# Altium footprint library PcbLib.PcbLib: 79 footprints (part 5 of 5)
Each footprint in its own frame and in the unit in brackets; x right, y up, seen from the top. Pads: shape width x height; smd on the part's side, far side on the other; paste and mask are expansions set on the pad; w line width, h text height; cw(c..) or ccw(c..) is an arc to the next point about the centre after c.
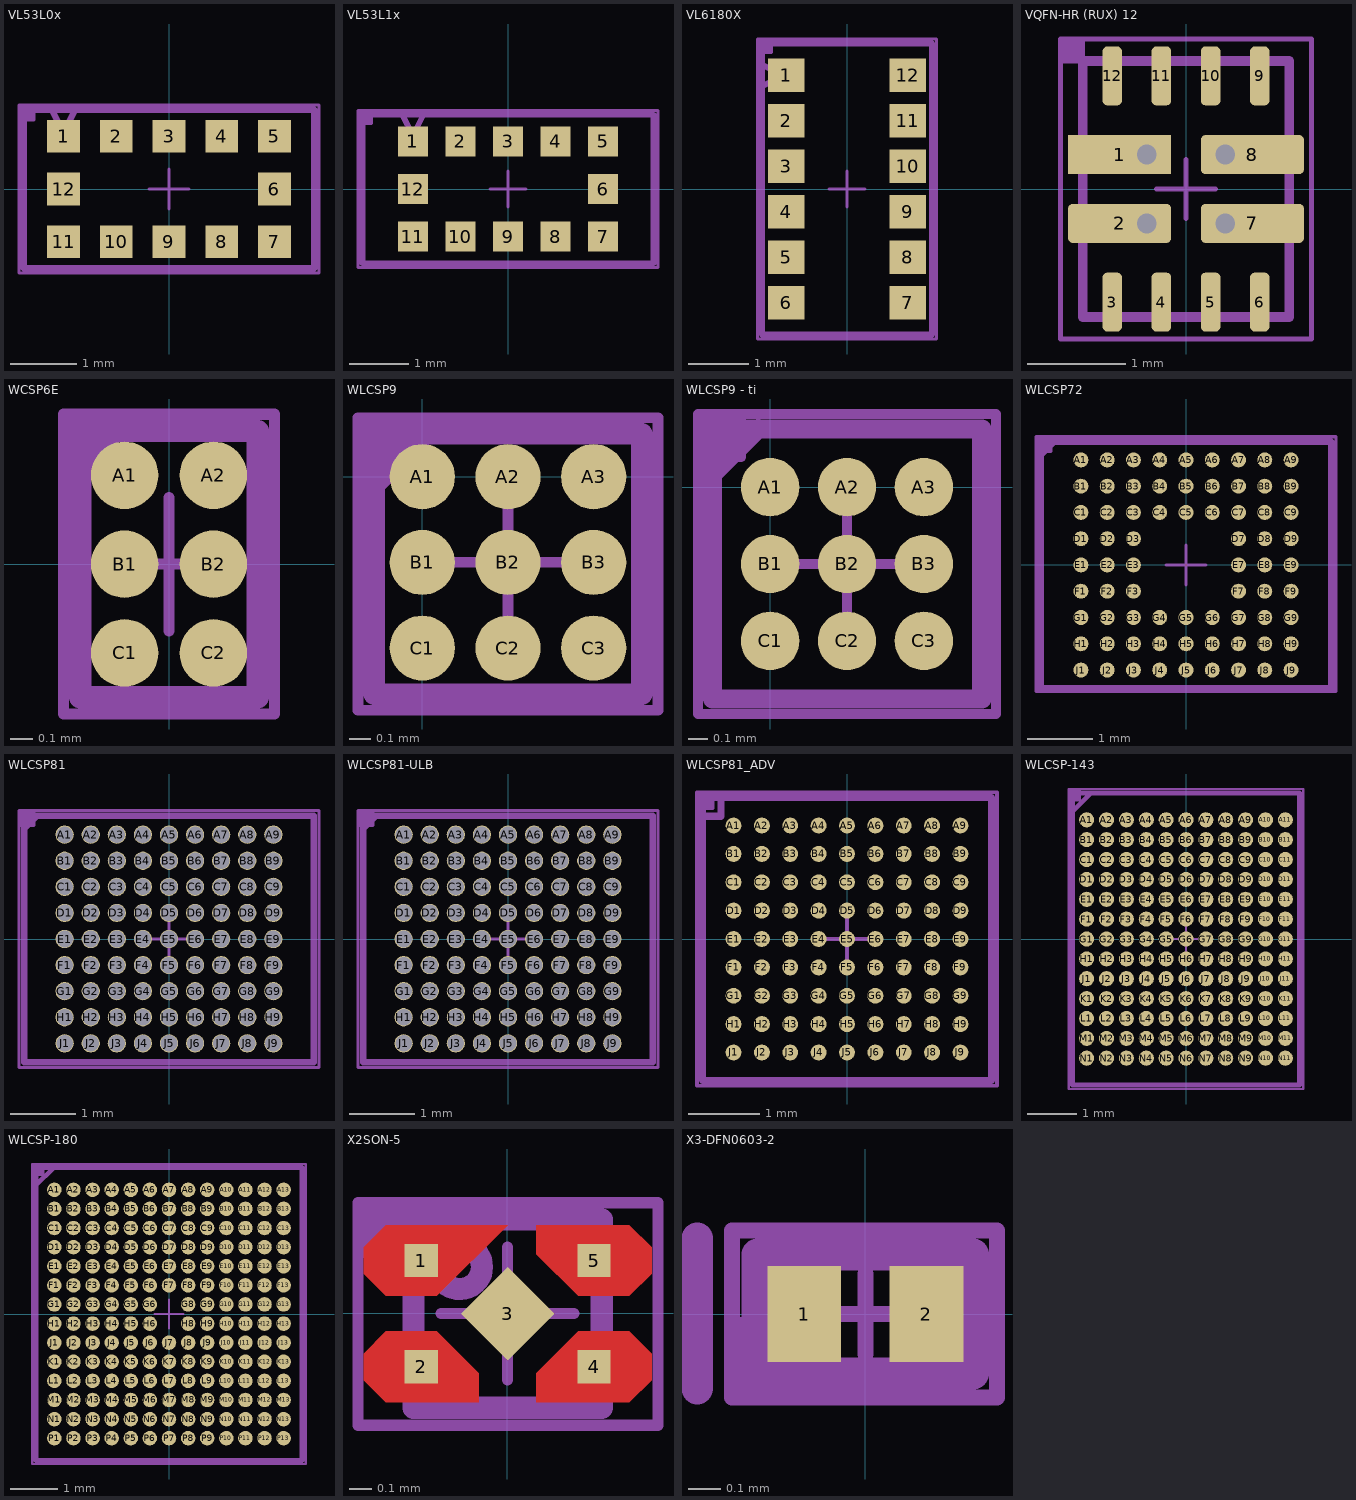
[diagram p4: the footprints below, top view; thin cyan lines are the x and y axes]

## VL53L0x [mm]
height 1
pads (12):
  rect 0.5x0.5 smd: 1(-1.6,0.8) 2(-0.8,0.8) 3(0,0.8) 4(0.8,0.8) 5(1.6,0.8) 6(1.6,0) 7(1.6,-0.8) 8(0.8,-0.8) 9(0,-0.8) 10(-0.8,-0.8) 11(-1.6,-0.8) 12(-1.6,0)
TopBody:
  lines w0.1: -1.778,1.2 -1.6,0.85 -1.422,1.2 ; -2.2,-1.2 -2.2,1.2 2.2,1.2 2.2,-1.2 -2.2,-1.2
TopCourtyard:
  region: -2.275,1.275 -2.275,1.05 -2.05,1.05 -2.05,1.275
  lines w0.05: -2.275,1.05 -2.05,1.05 -2.05,1.275 ; -0.3,0 0.3,0 ; 0,-0.3 0,0.3 ; -2.275,-1.275 -2.275,1.275 2.275,1.275 2.275,-1.275 -2.275,-1.275
3D body "VL53L0X.STEP": height 1, standoff 0, extent -2.2,-1.2 2.2,1.2

## VL53L1x [mm]
height 1.56
pads (12):
  rect 0.5x0.5 smd: 1(-1.6,0.8) 2(-0.8,0.8) 3(0,0.8) 4(0.8,0.8) 5(1.6,0.8) 6(1.6,0) 7(1.6,-0.8) 8(0.8,-0.8) 9(0,-0.8) 10(-0.8,-0.8) 11(-1.6,-0.8) 12(-1.6,0)
TopBody:
  lines w0.1: -1.778,1.25 -1.6,0.9 -1.422,1.25 ; -2.45,-1.25 -2.45,1.25 2.45,1.25 2.45,-1.25 -2.45,-1.25
TopCourtyard:
  region: -2.525,1.325 -2.525,1.1 -2.3,1.1 -2.3,1.325
  lines w0.05: -2.525,1.1 -2.3,1.1 -2.3,1.325 ; -0.3,0 0.3,0 ; 0,-0.3 0,0.3 ; -2.525,-1.325 -2.525,1.325 2.525,1.325 2.525,-1.325 -2.525,-1.325
3D body "vl53l1x.step": height 1.54, standoff -0.02, extent -2.45,-1.25 2.45,1.25

## VL6180X [mm]
height 1
pads (12):
  rect 0.6x0.55 smd: 1(-1,1.875) 2(-1,1.125) 3(-1,0.375) 4(-1,-0.375) 5(-1,-1.125) 6(-1,-1.875) 7(1,-1.875) 8(1,-1.125) 9(1,-0.375) 10(1,0.375) 11(1,1.125) 12(1,1.875)
TopBody:
  lines w0.1: -1.4,1.697 -1.05,1.875 -1.4,2.053 ; -1.4,-2.4 -1.4,2.4 1.4,2.4 1.4,-2.4 -1.4,-2.4
TopCourtyard:
  region: -1.475,2.475 -1.475,2.25 -1.25,2.25 -1.25,2.475
  lines w0.05: -1.475,2.25 -1.25,2.25 -1.25,2.475 ; -0.3,0 0.3,0 ; 0,-0.3 0,0.3 ; -1.475,-2.475 -1.475,2.475 1.475,2.475 1.475,-2.475 -1.475,-2.475
3D body: height 1, standoff 0, extent -1.4,-2.4 1.4,2.4

## VQFN-HR (RUX) 12 [mm]
pads (12):
  rect 1.05x0.4 smd paste+0 mask+0.05: 1(-0.675,0.35)
  rrect25% 1.05x0.4 smd paste+0 mask+0.05: 2(-0.675,-0.35) 7(0.675,-0.35) 8(0.675,0.35)
  rrect50% 0.2x0.6 smd paste+0 mask+0.05: 3(-0.75,-1.15) 4(-0.25,-1.15) 5(0.25,-1.15) 6(0.75,-1.15) 9(0.75,1.15) 10(0.25,1.15) 11(-0.25,1.15) 12(-0.75,1.15)
via -0.4,0.35 diameter 0.4 hole 0.2
via 0.4,0.35 diameter 0.4 hole 0.2
via 0.4,-0.35 diameter 0.4 hole 0.2
via -0.4,-0.35 diameter 0.4 hole 0.2
TopBody:
  circle w0.08: c-0.725,0.35 r0.152
  lines w0.1: -1.05,-1.3 -1.05,1.3 1.05,1.3 1.05,-1.3 -1.05,-1.3
TopCourtyard:
  region: -1.275,1.525 -1.275,1.3 -1.05,1.3 -1.05,1.525
  lines w0.05: -1.275,1.3 -1.05,1.3 -1.05,1.525 ; -0.3,0 0.3,0 ; 0,-0.3 0,0.3 ; -1.275,-1.525 1.275,-1.525 1.275,1.525 -1.275,1.525 -1.275,-1.525
3D body: height 1, standoff 0, extent -1.05,-1.3 1.05,1.3

## WCSP6E [mm]
height 0.55
pads (6):
  round 0.304 smd paste-0.039 mask-0.039: A1(-0.2,0.4) A2(0.2,0.4) B1(-0.2,0) B2(0.2,0) C1(-0.2,-0.4) C2(0.2,-0.4)
TopBody:
  lines w0.1: -0.4,-0.6 0.4,-0.6 0.4,0.6 -0.4,0.6 -0.4,-0.6
TopCourtyard:
  region: -0.475,0.675 -0.475,0.45 -0.25,0.45 -0.25,0.675
  lines w0.05: -0.475,0.45 -0.25,0.45 -0.25,0.675 ; -0.3,0 0.3,0 ; -0.217,0.676 -0.212,0.676 ; 0,-0.3 0,0.3 ; -0.475,-0.675 -0.475,0.675 0.475,0.675 0.475,-0.675 -0.475,-0.675
3D body: height 0.55, standoff 0, extent -0.4,-0.6 0.4,0.6
3D body: height 0.56, standoff 0.55, extent -0.321,0.321 -0.121,0.52

## WLCSP9 [mm]
height 0.58
pads (9):
  round 0.304 smd paste-0.039 mask-0.039: A1(0,0) A2(0.4,0) A3(0.8,0) B1(0,-0.4) B2(0.4,-0.4) B3(0.8,-0.4) C1(0,-0.8) C2(0.4,-0.8) C3(0.8,-0.8)
TopBody:
  lines w0.05: 0.014,0.2 0.014,0.204
  lines w0.1: -0.225,-0.034 -0.22,-0.034 ; -0.221,-0.035 0.013,0.199 ; -0.225,-1.015 -0.225,0.2 1.025,0.2 1.025,-1.015 -0.225,-1.015
TopCourtyard:
  region: -0.3,0.275 -0.3,0.05 -0.075,0.05 -0.075,0.275
  lines w0.05: -0.3,0.05 -0.075,0.05 -0.075,0.275 ; 0.1,-0.4 0.7,-0.4 ; 0.4,-0.7 0.4,-0.1 ; -0.3,-1.09 1.1,-1.09 1.1,0.275 -0.3,0.275 -0.3,-1.09
3D body: height 0.58, standoff 0, extent 0,0 0,0
3D body: height 0.58, standoff 0, extent -0.225,-1.015 1.025,0.2
3D body: height 0.59, standoff 0.01, extent -0.216,-0.044 0.024,0.19

## WLCSP9 - ti [mm]
height 0.58
pads (9):
  round 0.304 smd paste-0.039 mask-0.039: A1(0,0) A2(0.4,0) A3(0.8,0) B1(0,-0.4) B2(0.4,-0.4) B3(0.8,-0.4) C1(0,-0.8) C2(0.4,-0.8) C3(0.8,-0.8)
TopBody:
  lines w0.1: -0.3,0.297 -0.3,-1.102 1.1,-1.102 1.1,0.302 -0.3,0.302 ; -0.295,0.069 -0.061,0.303
TopCourtyard:
  region: -0.375,0.38 -0.375,0.155 -0.15,0.155 -0.15,0.38
  lines w0.05: -0.375,0.155 -0.15,0.155 -0.15,0.38 ; 0.1,-0.4 0.7,-0.4 ; 0.4,-0.7 0.4,-0.1 ; -0.375,-1.18 -0.375,0.38 1.175,0.38 1.175,-1.18 -0.375,-1.18
3D body: height 0.63, standoff 0, extent -0.3,-1.102 1.1,0.302
3D body: height 0.58, standoff 0, extent 0,0 0,0
3D body: height 0.64, standoff 0.01, extent -0.29,0.063 -0.05,0.297

## WLCSP72 [mil]
pads (72):
  round 9 smd paste+0.5 mask+1: A1(-62.99,62.99) A2(-47.24,62.99) A3(-31.5,62.99) A4(-15.75,62.99) A5(0,62.99) A6(15.75,62.99) A7(31.5,62.99) A8(47.24,62.99) A9(62.99,62.99) B1(-62.99,47.24) B2(-47.24,47.24) B3(-31.5,47.24) B4(-15.75,47.24) B5(0,47.24) B6(15.75,47.24) B7(31.5,47.24) B8(47.24,47.24) B9(62.99,47.24) C1(-62.99,31.5) C2(-47.24,31.5) C3(-31.5,31.5) C4(-15.75,31.5) C5(0,31.5) C6(15.75,31.5) C7(31.5,31.5) C8(47.24,31.5) C9(62.99,31.5) D1(-62.99,15.75) D2(-47.24,15.75) D3(-31.5,15.75) D7(31.5,15.75) D8(47.24,15.75) D9(62.99,15.75) E1(-62.99,0) E2(-47.24,0) E3(-31.5,0) E7(31.5,0) E8(47.24,0) E9(62.99,0) F1(-62.99,-15.75) F2(-47.24,-15.75) F3(-31.5,-15.75) F7(31.5,-15.75) F8(47.24,-15.75) F9(62.99,-15.75) G1(-62.99,-31.5) G2(-47.24,-31.5) G3(-31.5,-31.5) G4(-15.75,-31.5) G5(0,-31.5) G6(15.75,-31.5) G7(31.5,-31.5) G8(47.24,-31.5) G9(62.99,-31.5) H1(-62.99,-47.24) H2(-47.24,-47.24) H3(-31.5,-47.24) H4(-15.75,-47.24) H5(0,-47.24) H6(15.75,-47.24) H7(31.5,-47.24) H8(47.24,-47.24) H9(62.99,-47.24) J1(-62.99,-62.99) J2(-47.24,-62.99) J3(-31.5,-62.99) J4(-15.75,-62.99) J5(0,-62.99) J6(15.75,-62.99) J7(31.5,-62.99) J8(47.24,-62.99) J9(62.99,-62.99)
TopBody:
  lines w3.94: -87,66.13 -79.13,74 ; -87,-74 87,-74 87,74 -87,74 -87,-74
TopCourtyard:
  region: -89.96,76.97 -89.96,68.1 -81.09,68.1 -81.09,76.97
  lines w1.97: -89.96,68.1 -81.09,68.1 -81.09,76.97 ; -11.81,0 11.81,0 ; 0,-11.81 0,11.81 ; -89.96,-75.79 89.96,-75.79 89.96,76.97 -89.96,76.97 -89.96,-75.79
3D body "WLCSP72.stp": height 23.11, standoff 0, extent -87,-74.01 87.01,74.02

## WLCSP81 [mil]
pads (81):
  round 11 / inner round 60 / far side round 11 hole 10 paste+0 mask+0: A1(-62.99,62.99) A2(-47.24,62.99) A3(-31.5,62.99) A4(-15.75,62.99) A5(0,62.99) A6(15.75,62.99) A7(31.5,62.99) A8(47.24,62.99) A9(62.99,62.99) B1(-62.99,47.24) B2(-47.24,47.24) B3(-31.5,47.24) B4(-15.75,47.24) B5(0,47.24) B6(15.75,47.24) B7(31.5,47.24) B8(47.24,47.24) B9(62.99,47.24) C1(-62.99,31.5) C2(-47.24,31.5) C3(-31.5,31.5) C4(-15.75,31.5) C5(0,31.5) C6(15.75,31.5) C7(31.5,31.5) C8(47.24,31.5) C9(62.99,31.5) D1(-62.99,15.75) D2(-47.24,15.75) D3(-31.5,15.75) D4(-15.75,15.75) D5(0,15.75) D6(15.75,15.75) D7(31.5,15.75) D8(47.24,15.75) D9(62.99,15.75) E1(-62.99,0) E2(-47.24,0) E3(-31.5,0) E4(-15.75,0) E5(0,0) E6(15.75,0) E7(31.5,0) E8(47.24,0) E9(62.99,0) F1(-62.99,-15.75) F2(-47.24,-15.75) F3(-31.5,-15.75) F4(-15.75,-15.75) F5(0,-15.75) F6(15.75,-15.75) F7(31.5,-15.75) F8(47.24,-15.75) F9(62.99,-15.75) G1(-62.99,-31.5) G2(-47.24,-31.5) G3(-31.5,-31.5) G4(-15.75,-31.5) G5(0,-31.5) G6(15.75,-31.5) G7(31.5,-31.5) G8(47.24,-31.5) G9(62.99,-31.5) H1(-62.99,-47.24) H2(-47.24,-47.24) H3(-31.5,-47.24) H4(-15.75,-47.24) H5(0,-47.24) H6(15.75,-47.24) H7(31.5,-47.24) H8(47.24,-47.24) H9(62.99,-47.24) J1(-62.99,-62.99) J2(-47.24,-62.99) J3(-31.5,-62.99) J4(-15.75,-62.99) J5(0,-62.99) J6(15.75,-62.99) J7(31.5,-62.99) J8(47.24,-62.99) J9(62.99,-62.99)
TopBody:
  lines w3.94: -87.5,66.63 -79.63,74.5 ; -87.5,-74.5 -87.5,74.5 87.5,74.5 87.5,-74.5 -87.5,-74.5
TopCourtyard:
  region: -90.55,77.56 -90.55,68.69 -81.69,68.69 -81.69,77.56
  lines w1.97: -90.55,68.69 -81.69,68.69 -81.69,77.56 ; -11.81,0 11.81,0 ; 0,-11.81 0,11.81 ; -90.55,-77.56 90.55,-77.56 90.55,77.56 -90.55,77.56 -90.55,-77.56
3D body "WLCSP81.stp": height 23.11, standoff 0, extent -87.48,-74.49 87.48,74.49

## WLCSP81-ULB [mil]
pads (81):
  round 11 hole 10 mask-5.5: A1(-62.99,62.99) A2(-47.24,62.99) A3(-31.5,62.99) A4(-15.75,62.99) A5(0,62.99) A6(15.75,62.99) A7(31.5,62.99) A8(47.24,62.99) A9(62.99,62.99) B1(-62.99,47.24) B2(-47.24,47.24) B3(-31.5,47.24) B4(-15.75,47.24) B5(0,47.24) B6(15.75,47.24) B7(31.5,47.24) B8(47.24,47.24) B9(62.99,47.24) C1(-62.99,31.5) C2(-47.24,31.5) C3(-31.5,31.5) C4(-15.75,31.5) C5(0,31.5) C6(15.75,31.5) C7(31.5,31.5) C8(47.24,31.5) C9(62.99,31.5) D1(-62.99,15.75) D2(-47.24,15.75) D3(-31.5,15.75) D4(-15.75,15.75) D5(0,15.75) D6(15.75,15.75) D7(31.5,15.75) D8(47.24,15.75) D9(62.99,15.75) E1(-62.99,0) E2(-47.24,0) E3(-31.5,0) E4(-15.75,0) E5(0,0) E6(15.75,0) E7(31.5,0) E8(47.24,0) E9(62.99,0) F1(-62.99,-15.75) F2(-47.24,-15.75) F3(-31.5,-15.75) F4(-15.75,-15.75) F5(0,-15.75) F6(15.75,-15.75) F7(31.5,-15.75) F8(47.24,-15.75) F9(62.99,-15.75) G1(-62.99,-31.5) G2(-47.24,-31.5) G3(-31.5,-31.5) G4(-15.75,-31.5) G5(0,-31.5) G6(15.75,-31.5) G7(31.5,-31.5) G8(47.24,-31.5) G9(62.99,-31.5) H1(-62.99,-47.24) H2(-47.24,-47.24) H3(-31.5,-47.24) H4(-15.75,-47.24) H5(0,-47.24) H6(15.75,-47.24) H7(31.5,-47.24) H8(47.24,-47.24) H9(62.99,-47.24) J1(-62.99,-62.99) J2(-47.24,-62.99) J3(-31.5,-62.99) J4(-15.75,-62.99) J5(0,-62.99) J6(15.75,-62.99) J7(31.5,-62.99) J8(47.24,-62.99) J9(62.99,-62.99)
TopBody:
  lines w3.94: -87.5,66.63 -79.63,74.5 ; -87.5,-74.5 -87.5,74.5 87.5,74.5 87.5,-74.5 -87.5,-74.5
TopCourtyard:
  region: -90.55,77.56 -90.55,68.69 -81.69,68.69 -81.69,77.56
  lines w1.97: -90.55,68.69 -81.69,68.69 -81.69,77.56 ; -11.81,0 11.81,0 ; 0,-11.81 0,11.81 ; -90.55,-77.56 -90.55,77.56 90.55,77.56 90.55,-77.56 -90.55,-77.56

## WLCSP81_ADV [mm] "BGA, 81-Balls, Body 4.07x3.99mm, Pitch 0.4mm"
height 0.59
pads (81):
  round 0.225 smd mask+0.032: A1(-1.6,1.6) A2(-1.2,1.6) A3(-0.8,1.6) A4(-0.4,1.6) A5(0,1.6) A6(0.4,1.6) A7(0.8,1.6) A8(1.2,1.6) A9(1.6,1.6) B1(-1.6,1.2) B2(-1.2,1.2) B3(-0.8,1.2) B4(-0.4,1.2) B5(0,1.2) B6(0.4,1.2) B7(0.8,1.2) B8(1.2,1.2) B9(1.6,1.2) C1(-1.6,0.8) C2(-1.2,0.8) C3(-0.8,0.8) C4(-0.4,0.8) C5(0,0.8) C6(0.4,0.8) C7(0.8,0.8) C8(1.2,0.8) C9(1.6,0.8) D1(-1.6,0.4) D2(-1.2,0.4) D3(-0.8,0.4) D4(-0.4,0.4) D5(0,0.4) D6(0.4,0.4) D7(0.8,0.4) D8(1.2,0.4) D9(1.6,0.4) E1(-1.6,0) E2(-1.2,0) E3(-0.8,0) E4(-0.4,0) E5(0,0) E6(0.4,0) E7(0.8,0) E8(1.2,0) E9(1.6,0) F1(-1.6,-0.4) F2(-1.2,-0.4) F3(-0.8,-0.4) F4(-0.4,-0.4) F5(0,-0.4) F6(0.4,-0.4) F7(0.8,-0.4) F8(1.2,-0.4) F9(1.6,-0.4) G1(-1.6,-0.8) G2(-1.2,-0.8) G3(-0.8,-0.8) G4(-0.4,-0.8) G5(0,-0.8) G6(0.4,-0.8) G7(0.8,-0.8) G8(1.2,-0.8) G9(1.6,-0.8) H1(-1.6,-1.2) H2(-1.2,-1.2) H3(-0.8,-1.2) H4(-0.4,-1.2) H5(0,-1.2) H6(0.4,-1.2) H7(0.8,-1.2) H8(1.2,-1.2) H9(1.6,-1.2) J1(-1.6,-1.6) J2(-1.2,-1.6) J3(-0.8,-1.6) J4(-0.4,-1.6) J5(0,-1.6) J6(0.4,-1.6) J7(0.8,-1.6) J8(1.2,-1.6) J9(1.6,-1.6)
TopBody:
  lines w0.1: -2.037,1.731 -1.775,1.731 -1.775,1.993 ; -2.037,-1.993 -2.037,1.993 2.037,1.993 2.037,-1.993 -2.037,-1.993
TopCourtyard:
  region: -2.115,2.07 -2.115,1.845 -1.89,1.845 -1.89,2.07
  lines w0.05: -2.115,1.845 -1.89,1.845 -1.89,2.07 ; -0.3,0 0.3,0 ; 0,-0.3 0,0.3 ; -2.115,-2.07 2.115,-2.07 2.115,2.07 -2.115,2.07 -2.115,-2.07
3D body: height 0.59, standoff 0.18, extent -2.037,-1.993 2.037,1.993

## WLCSP-143 [mm]
pads (143):
  round 0.304 smd paste-0.039 mask-0.039: A1(-2,2.4) A2(-1.6,2.4) A3(-1.2,2.4) A4(-0.8,2.4) A5(-0.4,2.4) A6(0,2.4) A7(0.4,2.4) A8(0.8,2.4) A9(1.2,2.4) A10(1.6,2.4) A11(2,2.4) B1(-2,2) B2(-1.6,2) B3(-1.2,2) B4(-0.8,2) B5(-0.4,2) B6(0,2) B7(0.4,2) B8(0.8,2) B9(1.2,2) B10(1.6,2) B11(2,2) C1(-2,1.6) C2(-1.6,1.6) C3(-1.2,1.6) C4(-0.8,1.6) C5(-0.4,1.6) C6(0,1.6) C7(0.4,1.6) C8(0.8,1.6) C9(1.2,1.6) C10(1.6,1.6) C11(2,1.6) D1(-2,1.2) D2(-1.6,1.2) D3(-1.2,1.2) D4(-0.8,1.2) D5(-0.4,1.2) D6(0,1.2) D7(0.4,1.2) D8(0.8,1.2) D9(1.2,1.2) D10(1.6,1.2) D11(2,1.2) E1(-2,0.8) E2(-1.6,0.8) E3(-1.2,0.8) E4(-0.8,0.8) E5(-0.4,0.8) E6(0,0.8) E7(0.4,0.8) E8(0.8,0.8) E9(1.2,0.8) E10(1.6,0.8) E11(2,0.8) F1(-2,0.4) F2(-1.6,0.4) F3(-1.2,0.4) F4(-0.8,0.4) F5(-0.4,0.4) F6(0,0.4) F7(0.4,0.4) F8(0.8,0.4) F9(1.2,0.4) F10(1.6,0.4) F11(2,0.4) G1(-2,0) G2(-1.6,0) G3(-1.2,0) G4(-0.8,0) G5(-0.4,0) G6(0,0) G7(0.4,0) G8(0.8,0) G9(1.2,0) G10(1.6,0) G11(2,0) H1(-2,-0.4) H2(-1.6,-0.4) H3(-1.2,-0.4) H4(-0.8,-0.4) H5(-0.4,-0.4) H6(0,-0.4) H7(0.4,-0.4) H8(0.8,-0.4) H9(1.2,-0.4) H10(1.6,-0.4) H11(2,-0.4) J1(-2,-0.8) J2(-1.6,-0.8) J3(-1.2,-0.8) J4(-0.8,-0.8) J5(-0.4,-0.8) J6(0,-0.8) J7(0.4,-0.8) J8(0.8,-0.8) J9(1.2,-0.8) J10(1.6,-0.8) J11(2,-0.8) K1(-2,-1.2) K2(-1.6,-1.2) K3(-1.2,-1.2) K4(-0.8,-1.2) K5(-0.4,-1.2) K6(0,-1.2) K7(0.4,-1.2) K8(0.8,-1.2) K9(1.2,-1.2) K10(1.6,-1.2) K11(2,-1.2) L1(-2,-1.6) L2(-1.6,-1.6) L3(-1.2,-1.6) L4(-0.8,-1.6) L5(-0.4,-1.6) L6(0,-1.6) L7(0.4,-1.6) L8(0.8,-1.6) L9(1.2,-1.6) L10(1.6,-1.6) L11(2,-1.6) M1(-2,-2) M2(-1.6,-2) M3(-1.2,-2) M4(-0.8,-2) M5(-0.4,-2) M6(0,-2) M7(0.4,-2) M8(0.8,-2) M9(1.2,-2) M10(1.6,-2) M11(2,-2) N1(-2,-2.4) N2(-1.6,-2.4) N3(-1.2,-2.4) N4(-0.8,-2.4) N5(-0.4,-2.4) N6(0,-2.4) N7(0.4,-2.4) N8(0.8,-2.4) N9(1.2,-2.4) N10(1.6,-2.4) N11(2,-2.4)
TopBody:
  lines w0.1: -2.281,2.569 -1.908,2.942 ; -2.287,-2.942 -2.287,2.942 2.287,2.942 2.287,-2.942 -2.287,-2.942
TopCourtyard:
  region: -2.365,3.02 -2.365,2.795 -2.14,2.795 -2.14,3.02
  lines w0.05: -2.365,2.795 -2.14,2.795 -2.14,3.02 ; -0.3,0 0.3,0 ; 0,-0.3 0,0.3 ; -2.365,-3.02 2.365,-3.02 2.365,3.02 -2.365,3.02 -2.365,-3.02
3D body "WLCSP-143.step": height 1.27, standoff 0, extent -2.287,-2.942 2.287,2.942

## WLCSP-180 [mm]
pads (180):
  round 0.304 smd paste-0.039 mask-0.039: A1(-2.4,2.6) A2(-2,2.6) A3(-1.6,2.6) A4(-1.2,2.6) A5(-0.8,2.6) A6(-0.4,2.6) A7(0,2.6) A8(0.4,2.6) A9(0.8,2.6) A10(1.2,2.6) A11(1.6,2.6) A12(2,2.6) A13(2.4,2.6) B1(-2.4,2.2) B2(-2,2.2) B3(-1.6,2.2) B4(-1.2,2.2) B5(-0.8,2.2) B6(-0.4,2.2) B7(0,2.2) B8(0.4,2.2) B9(0.8,2.2) B10(1.2,2.2) B11(1.6,2.2) B12(2,2.2) B13(2.4,2.2) C1(-2.4,1.8) C2(-2,1.8) C3(-1.6,1.8) C4(-1.2,1.8) C5(-0.8,1.8) C6(-0.4,1.8) C7(0,1.8) C8(0.4,1.8) C9(0.8,1.8) C10(1.2,1.8) C11(1.6,1.8) C12(2,1.8) C13(2.4,1.8) D1(-2.4,1.4) D2(-2,1.4) D3(-1.6,1.4) D4(-1.2,1.4) D5(-0.8,1.4) D6(-0.4,1.4) D7(0,1.4) D8(0.4,1.4) D9(0.8,1.4) D10(1.2,1.4) D11(1.6,1.4) D12(2,1.4) D13(2.4,1.4) E1(-2.4,1) E2(-2,1) E3(-1.6,1) E4(-1.2,1) E5(-0.8,1) E6(-0.4,1) E7(0,1) E8(0.4,1) E9(0.8,1) E10(1.2,1) E11(1.6,1) E12(2,1) E13(2.4,1) F1(-2.4,0.6) F2(-2,0.6) F3(-1.6,0.6) F4(-1.2,0.6) F5(-0.8,0.6) F6(-0.4,0.6) F7(0,0.6) F8(0.4,0.6) F9(0.8,0.6) F10(1.2,0.6) F11(1.6,0.6) F12(2,0.6) F13(2.4,0.6) G1(-2.4,0.2) G2(-2,0.2) G3(-1.6,0.2) G4(-1.2,0.2) G5(-0.8,0.2) G6(-0.4,0.2) G8(0.4,0.2) G9(0.8,0.2) G10(1.2,0.2) G11(1.6,0.2) G12(2,0.2) G13(2.4,0.2) H1(-2.4,-0.2) H2(-2,-0.2) H3(-1.6,-0.2) H4(-1.2,-0.2) H5(-0.8,-0.2) H6(-0.4,-0.2) H8(0.4,-0.2) H9(0.8,-0.2) H10(1.2,-0.2) H11(1.6,-0.2) H12(2,-0.2) H13(2.4,-0.2) J1(-2.4,-0.6) J2(-2,-0.6) J3(-1.6,-0.6) J4(-1.2,-0.6) J5(-0.8,-0.6) J6(-0.4,-0.6) J7(0,-0.6) J8(0.4,-0.6) J9(0.8,-0.6) J10(1.2,-0.6) J11(1.6,-0.6) J12(2,-0.6) J13(2.4,-0.6) K1(-2.4,-1) K2(-2,-1) K3(-1.6,-1) K4(-1.2,-1) K5(-0.8,-1) K6(-0.4,-1) K7(0,-1) K8(0.4,-1) K9(0.8,-1) K10(1.2,-1) K11(1.6,-1) K12(2,-1) K13(2.4,-1) L1(-2.4,-1.4) L2(-2,-1.4) L3(-1.6,-1.4) L4(-1.2,-1.4) L5(-0.8,-1.4) L6(-0.4,-1.4) L7(0,-1.4) L8(0.4,-1.4) L9(0.8,-1.4) L10(1.2,-1.4) L11(1.6,-1.4) L12(2,-1.4) L13(2.4,-1.4) M1(-2.4,-1.8) M2(-2,-1.8) M3(-1.6,-1.8) M4(-1.2,-1.8) M5(-0.8,-1.8) M6(-0.4,-1.8) M7(0,-1.8) M8(0.4,-1.8) M9(0.8,-1.8) M10(1.2,-1.8) M11(1.6,-1.8) M12(2,-1.8) M13(2.4,-1.8) N1(-2.4,-2.2) N2(-2,-2.2) N3(-1.6,-2.2) N4(-1.2,-2.2) N5(-0.8,-2.2) N6(-0.4,-2.2) N7(0,-2.2) N8(0.4,-2.2) N9(0.8,-2.2) N10(1.2,-2.2) N11(1.6,-2.2) N12(2,-2.2) N13(2.4,-2.2) P1(-2.4,-2.6) P2(-2,-2.6) P3(-1.6,-2.6) P4(-1.2,-2.6) P5(-0.8,-2.6) P6(-0.4,-2.6) P7(0,-2.6) P8(0.4,-2.6) P9(0.8,-2.6) P10(1.2,-2.6) P11(1.6,-2.6) P12(2,-2.6) P13(2.4,-2.6)
TopBody:
  lines w0.025: -2.786,2.667 -2.786,-3.065 2.786,-3.065 2.786,3.065 -2.786,3.065
  lines w0.1: -2.786,2.692 -2.413,3.065 ; -2.786,-3.065 -2.786,3.065 2.786,3.065 2.786,-3.065 -2.786,-3.065
TopCourtyard:
  region: -2.86,3.14 -2.86,2.915 -2.635,2.915 -2.635,3.14
  lines w0.05: -2.86,2.915 -2.635,2.915 -2.635,3.14 ; -0.3,0 0.3,0 ; 0,-0.3 0,0.3 ; -2.86,-3.14 -2.86,3.14 2.86,3.14 2.86,-3.14 -2.86,-3.14
3D body "WLCSP-180.step": height 1.27, standoff 0, extent -2.786,-3.065 2.786,3.065

## X2SON-5 [mm]
pads (5):
  rect 0.15x0.15 smd paste+0 mask+0: 1(-0.389,0.239) 2(-0.389,-0.241) 4(0.391,-0.241) 5(0.391,0.239)
  rect 0.3x0.3 smd rot 135 paste-0.03 mask-0.03: 3(0.001,-0.001)
Top Layer:
  region: -0.318,0.079 -0.549,0.079 -0.649,0.179 -0.649,0.299 -0.549,0.399 0.002,0.399
  region: 0.551,-0.401 0.131,-0.401 0.131,-0.27 0.32,-0.081 0.551,-0.081 0.651,-0.181 0.651,-0.301
  region: 0.551,0.079 0.32,0.079 0.131,0.268 0.131,0.399 0.551,0.399 0.651,0.299 0.651,0.179
  region: -0.129,-0.401 -0.549,-0.401 -0.649,-0.301 -0.649,-0.181 -0.549,-0.081 -0.318,-0.081 -0.129,-0.27
Top Paste:
  region: -0.339,0.129 -0.528,0.129 -0.599,0.2 -0.599,0.278 -0.528,0.349 -0.119,0.349
  region: 0.53,-0.351 0.181,-0.351 0.181,-0.291 0.341,-0.131 0.53,-0.131 0.601,-0.202 0.601,-0.28
  region: 0.53,0.129 0.341,0.129 0.181,0.289 0.181,0.349 0.53,0.349 0.601,0.278 0.601,0.2
  region: -0.179,-0.351 -0.528,-0.351 -0.599,-0.28 -0.599,-0.202 -0.528,-0.131 -0.339,-0.131 -0.179,-0.291
Top Solder:
  region: -0.339,0.129 -0.528,0.129 -0.599,0.2 -0.599,0.278 -0.528,0.349 -0.119,0.349
  region: 0.53,-0.351 0.181,-0.351 0.181,-0.291 0.341,-0.131 0.53,-0.131 0.601,-0.202 0.601,-0.28
  region: 0.53,0.129 0.341,0.129 0.181,0.289 0.181,0.349 0.53,0.349 0.601,0.278 0.601,0.2
  region: -0.179,-0.351 -0.528,-0.351 -0.599,-0.28 -0.599,-0.202 -0.528,-0.131 -0.339,-0.131 -0.179,-0.291
TopBody:
  circle w0.1: c-0.215,0.21 r0.1
  lines w0.1: -0.424,-0.426 0.426,-0.426 0.426,0.424 -0.424,0.424 -0.424,-0.426
TopCourtyard:
  region: -0.675,0.5 -0.675,0.275 -0.45,0.275 -0.45,0.5
  lines w0.05: -0.675,0.275 -0.45,0.275 -0.45,0.5 ; -0.3,0 0.3,0 ; 0,-0.3 0,0.3 ; -0.675,-0.505 -0.675,0.5 0.68,0.5 0.68,-0.505 -0.675,-0.505
3D body: height 0.26, standoff 0.25, extent -0.346,0.147 -0.147,0.346
3D body: height 0.25, standoff 0, extent -0.426,-0.426 0.426,0.426

## X3-DFN0603-2 [mm]
height 0.3
pads (2):
  rect 0.23x0.3 smd mask+0.05: 1(-0.19,0) 2(0.19,0)
Top Solder:
  rectangle: -0.207,-0.2 0.355,0.2
TopBody:
  lines w0.1: -0.335,-0.185 -0.335,0.185 0.335,0.185 0.335,-0.185 -0.335,-0.185
TopCourtyard:
  region: -0.415,-0.035 -0.415,-0.26 -0.19,-0.26 -0.19,-0.035
  lines w0.05: -0.415,-0.035 -0.19,-0.035 -0.19,-0.26 ; -0.155,0 0.16,0 ; 0,-0.125 0,0.125 ; -0.415,-0.26 0.41,-0.26 0.41,0.26 -0.415,0.26 -0.415,-0.26
  lines w0.1: -0.524,-0.231 -0.524,0.235
3D body: height 0.25, standoff 0, extent 1.325,0.2 1.325,0.2
3D body: height 0.34, standoff 0, extent -0.175,-0.185 0.335,0.185
3D body: height 0.34, standoff 0, extent -0.335,-0.185 -0.175,0.185